# Altium schematic symbol library FPGA_Xilinx_Virtex5.SchLib: 41 symbols (part 12 of 17) (continued)
## XC5VLX330-FF1760 (continued)
part L pins: AU10 VCCO_30, AV1 IO_L0P_30, AV7 VCCO_30, AW1 IO_L0N_30, AW2 IO_L1P_30, AW3 IO_L3N_30, AW5 IO_L5N_30, AW6 IO_L9N_CC_30, AW7 IO_L9P_CC_30, AW8 IO_L11N_CC_30, AW10 IO_L13N_30, AW11 IO_L16P_30, AW12 IO_L16N_30, AY2 IO_L1N_30, AY3 IO_L3P_30, AY4 IO_L6P_30, AY5 IO_L5P_30, AY7 IO_L11P_CC_30, AY8 IO_L15P_30, AY9 IO_L15N_30, AY10 IO_L13P_30, AY12 IO_L19N_30, AY13 IO_L19P_30, BA1 IO_L2P_30, BA2 IO_L2N_30, BA4 IO_L6N_30, BA5 IO_L7P_30, BA6 IO_L10N_CC_30, BA7 IO_L8N_CC_30, BA8 VCCO_30, BA9 IO_L12N_VRP_30, BA10 IO_L14N_VREF_30, BA11 IO_L18N_30, BA12 IO_L17P_30, BB2 IO_L4P_30, BB3 IO_L4N_VREF_30, BB4 IO_L7N_30, BB6 IO_L10P_CC_30, BB7 IO_L8P_CC_30, BB8 IO_L12P_VRN_30, BB9 IO_L14P_30, BB11 IO_L18P_30, BB12 IO_L17N_30, D15 IO_L0N_31, D16 IO_L2P_31, D17 IO_L2N_31, D18 IO_L6P_31, D20 IO_L9N_CC_31, D21 IO_L9P_CC_31, D22 IO_L8P_CC_31, D23 IO_L8N_CC_31, D25 IO_L12P_VRN_31, D26 IO_L12N_VRP_31, D27 IO_L17P_31, D28 IO_L17N_31, D29 VCCO_31, D30 IO_L19P_31, E14 IO_L0P_31, E15 IO_L1P_31, E17 IO_L4N_VREF_31, E18 IO_L6N_31, E19 IO_L7P_31, E20 IO_L5P_31, E22 IO_L10N_CC_31, E23 IO_L11P_CC_31, E24 IO_L13P_31, E25 IO_L13N_31, E27 IO_L14N_VREF_31, E28 IO_L16N_31, E29 IO_L16P_31, E30 IO_L19N_31, F14 IO_L1N_31, F15 IO_L3N_31, F16 IO_L3P_31, F17 IO_L4P_31, F19 IO_L7N_31, F20 IO_L5N_31, F21 IO_L10P_CC_31, F24 IO_L11N_CC_31, F25 IO_L15N_31, F26 IO_L15P_31, F27 IO_L14P_31, F29 IO_L18N_31, F30 IO_L18P_31, G30 VCCO_31, H27 VCCO_31
part M pins: A14 IO_L16P_32, A15 IO_L16N_32, A16 IO_L14P_32, A17 IO_L14N_VREF_32, A19 IO_L12P_VRN_32, A20 IO_L10P_CC_32, A21 IO_L11P_CC_32, A22 IO_L11N_CC_32, A24 IO_L6N_32, A25 IO_L4N_VREF_32, A26 IO_L1N_32, A27 IO_L3N_32, A29 IO_L0P_32, AU14 IO_L18P_33, AU16 IO_L14N_VREF_33, AU17 IO_L14P_33, AU18 IO_L12P_VRN_33, AU19 IO_L12N_VRP_33, AU22 IO_L9N_CC_33, AU23 IO_L9P_CC_33, AU24 IO_L3N_33, AU26 IO_L1N_33, AU27 IO_L4N_VREF_33, AU28 IO_L4P_33, AU30 VCCO_33, AV13 IO_L16P_33, AV14 IO_L18N_33, AV15 IO_L19N_33, AV16 IO_L17N_33, AV18 IO_L15N_33, AV19 IO_L13N_33, AV20 IO_L10N_CC_33, AV21 IO_L10P_CC_33, AV23 IO_L7N_33, AV24 IO_L7P_33, AV25 IO_L3P_33, AV26 IO_L1P_33, AV28 IO_L6N_33, AV29 IO_L0P_33, AV30 IO_L2P_33, AW13 IO_L16N_33, AW15 IO_L19P_33, AW16 IO_L17P_33, AW17 IO_L15P_33, AW18 IO_L13P_33, AW20 IO_L11N_CC_33, AW21 IO_L11P_CC_33, AW22 IO_L5N_33, AW23 IO_L5P_33, AW25 IO_L8N_CC_33, AW26 IO_L8P_CC_33, AW27 IO_L6P_33, AW28 IO_L0N_33, AW30 IO_L2N_33, AY31 VCCO_33, B13 IO_L19P_32, B14 IO_L19N_32, B15 VCCO_32, B16 IO_L17P_32, B17 IO_L15P_32, B18 IO_L15N_32, B19 IO_L12N_VRP_32, B21 IO_L10N_CC_32, B22 IO_L8N_CC_32, B23 IO_L6P_32, B24 IO_L4P_32, B26 IO_L7N_32, B27 IO_L1P_32, B28 IO_L3P_32, B29 IO_L0N_32, BA28 VCCO_33, C12 VCCO_32, C14 IO_L18P_32, C15 IO_L18N_32, C16 IO_L17N_32, C18 IO_L13P_32, C19 IO_L13N_32, C20 IO_L9N_CC_32, C21 IO_L9P_CC_32, C23 IO_L8P_CC_32, C24 IO_L5P_32, C25 IO_L5N_32, C26 IO_L7P_32, C28 IO_L2N_32, C29 IO_L2P_32, F13 VCCO_32
part N pins: AK17 IO_L1N_GC_D12_4, AK27 IO_L0N_GC_D14_4, AK28 IO_L0P_GC_D15_4, AL16 IO_L1P_GC_D13_4, AL27 IO_L8P_CC_GC_4, AM13 IO_L5P_GC_4, AM14 IO_L5N_GC_4, AM16 IO_L3N_GC_D8_4, AM27 IO_L8N_CC_GC_4, AM28 IO_L6P_GC_4, AM29 IO_L2P_GC_D11_4, AN13 IO_L9N_CC_GC_4, AN14 IO_L7N_GC_VRP_4, AN15 IO_L7P_GC_VRN_4, AN16 IO_L3P_GC_D9_4, AN28 IO_L6N_GC_4, AN29 IO_L4N_GC_VREF_4, AN30 IO_L2N_GC_D10_4, AP13 IO_L9P_CC_GC_4, AP30 IO_L4P_GC_4, AT13 VCCO_34, AV17 VCCO_4, AW14 VCCO_34, AY11 VCCO_34, AY14 IO_L1P_34, AY15 IO_L1N_34, AY17 IO_L7P_34, AY18 IO_L7N_34, AY19 IO_L6P_34, AY20 IO_L10N_CC_34, AY22 IO_L11P_CC_34, AY23 IO_L11N_CC_34, AY24 IO_L12N_VRP_34, AY25 IO_L12P_VRN_34, AY27 IO_L17P_34, AY28 IO_L17N_34, AY29 IO_L19N_34, BA14 IO_L0N_34, BA15 IO_L3P_34, BA16 IO_L2N_34, BA17 IO_L5N_34, BA18 VCCO_4, BA19 IO_L6N_34, BA20 IO_L10P_CC_34, BA21 IO_L8P_CC_34, BA22 IO_L8N_CC_34, BA24 IO_L13N_34, BA25 IO_L15N_34, BA26 IO_L14N_VREF_34, BA27 IO_L16P_34, BA29 IO_L19P_34, BB13 IO_L0P_34, BB14 IO_L3N_34, BB16 IO_L2P_34, BB17 IO_L5P_34, BB18 IO_L4P_34, BB19 IO_L4N_VREF_34, BB21 IO_L9P_CC_34, BB22 IO_L9N_CC_34, BB23 IO_L13P_34, BB24 IO_L15P_34, BB26 IO_L14P_34, BB27 IO_L16N_34, BB28 IO_L18N_34, BB29 IO_L18P_34
part O pins: AJ18 IO_L16N_6, AJ25 IO_L17P_6, AK18 IO_L1P_6, AK19 IO_L16P_6, AK24 IO_L17N_6, AK25 IO_L19N_6, AL17 IO_L1N_6, AL19 IO_L18P_6, AL24 IO_L19P_6, AL25 IO_L15P_6, AL26 IO_L0P_6, AM17 IO_L3N_6, AM18 IO_L3P_6, AM19 IO_L18N_6, AM24 IO_L15N_6, AM26 IO_L0N_6, AN18 IO_L5P_6, AN19 IO_L7P_6, AN25 IO_L4N_VREF_6, AN26 IO_L4P_6, AP15 IO_L9N_CC_6, AP16 IO_L12P_VRN_6, AP17 IO_L5N_6, AP18 IO_L7N_6, AP26 IO_L6P_6, AP27 IO_L2N_6, AP28 IO_L2P_6, AR13 IO_L10P_CC_6, AR14 IO_L10N_CC_6, AR15 IO_L9P_CC_6, AR17 IO_L12N_VRP_6, AR27 IO_L6N_6, AR28 IO_L8P_CC_6, AR29 IO_L8N_CC_6, AR30 IO_L11N_CC_6, AT14 IO_L14P_6, AT15 IO_L14N_VREF_6, AT23 VCCO_6, AT29 IO_L13N_6, AT30 IO_L11P_CC_6, AU29 IO_L13P_6, AW24 VCCO_6, AY21 VCCO_6, B25 VCCO_5, C22 VCCO_5, F23 VCCO_5, G14 IO_L1P_5, G16 IO_L3N_5, G27 IO_L15P_5, G28 IO_L17P_5, G29 IO_L17N_5, H14 IO_L1N_5, H15 IO_L7P_5, H16 IO_L3P_5, H28 IO_L15N_5, H29 IO_L19P_5, H30 IO_L19N_5, J15 IO_L7N_5, J16 IO_L5N_5, J17 IO_L5P_5, J26 IO_L11P_CC_5, J27 IO_L11N_CC_5, J28 IO_L13P_5, K17 IO_L12P_VRN_5, K18 IO_L12N_VRP_5, K19 IO_L9P_CC_5, K24 IO_L4N_VREF_5, K25 IO_L4P_5, K27 IO_L13N_5, L17 IO_L14N_VREF_5, L19 IO_L9N_CC_5, L24 IO_L2N_5, L25 IO_L2P_5, L26 IO_L6N_5, M17 IO_L14P_5, M18 IO_L10P_CC_5, M19 IO_L10N_CC_5, M24 IO_L0P_5, M26 IO_L6P_5, N18 IO_L16P_5, N19 IO_L16N_5, N24 IO_L0N_5, N25 IO_L8N_CC_5, P18 IO_L18N_5, P25 IO_L8P_CC_5, R18 IO_L18P_5
part P pins: AJ20 IO_L1N_8, AJ21 IO_L1P_8, AJ22 IO_L0N_8, AJ23 IO_L0P_8, AK20 IO_L3P_8, AK22 IO_L2N_8, AK23 IO_L2P_8, AL20 IO_L3N_8, AL21 IO_L5N_8, AL22 IO_L17P_8, AM21 IO_L5P_8, AM22 IO_L17N_8, AM23 IO_L15P_8, AN20 IO_L7N_8, AN21 IO_L9P_CC_8, AN23 IO_L15N_8, AN24 IO_L13N_8, AP19 VCCO_8, AP20 IO_L7P_8, AP21 IO_L9N_CC_8, AP22 IO_L19N_8, AP23 IO_L13P_8, AP25 IO_L4P_8, AR16 VCCO_8, AR18 IO_L10P_CC_8, AR19 IO_L10N_CC_8, AR20 IO_L14P_8, AR22 IO_L19P_8, AR23 IO_L11P_CC_8, AR24 IO_L11N_CC_8, AR25 IO_L4N_VREF_8, AT16 IO_L12P_VRN_8, AT17 IO_L12N_VRP_8, AT19 IO_L14N_VREF_8, AT20 IO_L16P_8, AT21 IO_L16N_8, AT22 IO_L18N_8, AT24 IO_L8N_CC_8, AT25 IO_L8P_CC_8, AT26 IO_L6N_8, AT27 IO_L6P_8, AU20 VCCO_8, AU21 IO_L18P_8, D19 VCCO_7, F22 IO_L11N_CC_7, G17 IO_L12P_VRN_7, G18 IO_L12N_VRP_7, G19 IO_L10N_CC_7, G20 VCCO_7, G21 IO_L9P_CC_7, G22 IO_L11P_CC_7, G23 IO_L13N_7, G24 IO_L15N_7, G26 IO_L19P_7, H17 VCCO_7, H18 IO_L14N_VREF_7, H19 IO_L10P_CC_7, H20 IO_L9N_CC_7, H21 IO_L7N_7, H23 IO_L13P_7, H24 IO_L15P_7, H25 IO_L17P_7, H26 IO_L19N_7, J18 IO_L14P_7, J20 IO_L16N_7, J21 IO_L7P_7, J22 IO_L8P_CC_7, J23 IO_L8N_CC_7, J25 IO_L17N_7, K20 IO_L16P_7, K22 IO_L6P_7, K23 IO_L6N_7, L20 IO_L18P_7, L21 IO_L18N_7, L22 IO_L4P_7, M21 IO_L5N_7, M22 IO_L4N_VREF_7, M23 IO_L0P_7, N20 IO_L1N_7, N21 IO_L3N_7, N22 IO_L5P_7, N23 IO_L0N_7, P20 IO_L1P_7, P21 IO_L3P_7, P22 IO_L2N_7, P23 IO_L2P_7
part Q pins: AA21 VREFN_0, AA22 VP_0, AB21 VN_0, AB22 VREFP_0, AC21 DXN_0, AC22 DXP_0, AE30 TCK_0, AF14 TMS_0, AF15 CCLK_0, AF30 M1_0, AG14 TDI_0, AG29 M0_0, AG30 VCCO_0, AH14 TDO_0, AH15 D_OUT_BUSY_0, AH28 M2_0, AL28 VCCO_0, R14 D_IN_0, R30 RDWR_B_0, T14 HSWAPEN_0, T15 DONE_0, T29 PROGRAM_B_0, T30 CS_B_0, U14 INIT_B_0
part R pins: A3 GND, A8 GND, A13 GND, A18 GND, A23 GND, A28 GND, A33 GND, A38 GND, AA12 VCCAUX, AA14 VCCINT, AA16 VCCINT, AA18 VCCINT, AA20 VCCINT, AA24 VCCINT, AA26 VCCINT, AA28 VCCINT, AA30 VCCAUX, AB13 VCCINT, AB15 VCCINT, AB17 VCCINT, AB19 VCCINT, AB23 VCCINT, AB25 VCCINT, AB27 VCCINT, AB29 VCCAUX, AB31 VCCAUX, AC12 VCCAUX, AC14 VCCINT, AC16 VCCINT, AC18 VCCINT, AC20 VCCINT, AC24 VCCINT, AC26 VCCINT, AC28 VCCINT, AC30 VCCAUX, AD13 VCCAUX, AD15 VCCINT, AD17 VCCINT, AD19 VCCINT, AD21 VCCINT, AD23 VCCINT, AD25 VCCINT, AD27 VCCINT, AD29 VCCAUX, AE12 VCCAUX, AE14 VCCINT, AE16 VCCINT, AE18 VCCINT, AE20 VCCINT, AE22 VCCINT, AE24 VCCINT, AE26 VCCINT, AE28 VCCINT, AF13 VCCAUX, AF17 VCCINT, AF19 VCCINT, AF21 VCCINT, AF23 VCCINT, AF25 VCCINT, AF27 VCCINT, AF29 VCCAUX, AG16 VCCINT, AG18 VCCINT, AG20 VCCINT, AG22 VCCINT, AG24 VCCINT, AG26 VCCINT, AG28 VCCINT, AH13 VCCAUX, AH17 VCCINT, AH19 VCCINT, AH21 VCCINT, AH23 VCCINT, AH25 VCCINT, AH27 VCCINT, AJ24 VCCINT, B5 GND, B10 GND, B20 GND, B30 GND, B40 GND, C2 GND, C7 GND, C17 GND, C27 GND, C37 GND, C42 GND, D4 GND, D14 GND, D24 GND, D34 GND, E1 GND, E11 GND, E21 GND, E31 GND, E41 GND, F8 GND, F18 GND, F28 GND, F38 GND, G5 GND, G15 GND, G25 GND, G35 GND, H2 GND, H12 GND, H22 GND, H32 GND, H42 GND, J9 GND, J19 GND, J29 GND, J34 GND, J39 GND, K1 GND, K6 GND, K11 GND, K16 GND, K21 GND, K26 GND, K31 GND, K36 GND, L3 GND, L13 GND, L18 GND, L23 GND, L28 GND, L33 GND, M10 GND, M15 GND, M20 GND, M25 GND, M30 GND, M40 GND, N2 GND, N7 GND, N12 GND, N17 GND, N27 GND, N32 GND, N37 GND, N42 GND, P4 GND, P14 GND, P19 GND, P24 GND, P29 GND, P34 GND, R1 GND, R11 GND, R12 VCCAUX, R13 GND, R16 GND, R19 GND, R20 VCCINT, R21 GND, R22 VCCINT, R23 GND, R24 VCCINT, R25 GND, R26 VCCINT, R29 VBATT_0, R31 GND, R41 GND, T8 GND, T12 GND, T13 VCCAUX, T16 GND, T17 VCCINT, T18 GND, T19 VCCINT, T20 GND, T21 VCCINT, T22 GND, T23 VCCINT, T24 GND, T25 VCCINT, T26 GND, T27 VCCINT, T28 GND, T33 GND, U12 VCCAUX, U16 VCCINT, U18 VCCINT, U20 VCCINT, U22 VCCINT, U24 VCCINT, U26 VCCINT, U28 VCCINT, U30 VCCAUX, V13 VCCINT, V15 VCCINT, V17 VCCINT, V19 VCCINT, V21 VCCINT, V23 VCCINT, V25 VCCINT, V27 VCCINT, V29 VCCAUX, W12 VCCAUX, W14 VCCINT, W16 VCCINT, W18 VCCINT, W20 VCCINT, W22 VCCINT, W24 VCCINT, W26 VCCINT, W28 VCCINT, W30 VCCAUX, Y13 VCCINT, Y15 VCCINT, Y17 VCCINT, Y19 VCCINT, Y21 AVSS_0, Y22 AVDD_0, Y23 VCCINT, Y25 VCCINT, Y27 VCCINT, Y29 VCCINT, Y31 VCCAUX
part S pins: AA3 GND, AA13 GND, AA15 GND, AA17 GND, AA19 GND, AA23 GND, AA25 GND, AA27 GND, AA29 GND, AA31 GND, AA33 GND, AB10 GND, AB12 GND, AB14 GND, AB16 GND, AB18 GND, AB20 GND, AB24 GND, AB26 GND, AB28 GND, AB30 GND, AB40 GND, AC2 GND, AC7 GND, AC13 GND, AC15 GND, AC17 GND, AC19 GND, AC23 GND, AC25 GND, AC27 GND, AC29 GND, AC31 GND, AC32 GND, AC37 GND, AC42 GND, AD4 GND, AD12 GND, AD14 GND, AD16 GND, AD18 GND, AD20 GND, AD22 GND, AD24 GND, AD26 GND, AD28 GND, AD30 GND, AD34 GND, AE1 GND, AE11 GND, AE13 GND, AE15 GND, AE17 GND, AE19 GND, AE21 GND, AE23 GND, AE25 GND, AE27 GND, AE29 GND, AE31 GND, AE41 GND, AF8 GND, AF16 GND, AF18 GND, AF20 GND, AF22 GND, AF24 GND, AF26 GND, AF28 GND, AF33 GND, AF38 GND, AG5 GND, AG13 GND, AG15 GND, AG17 GND, AG19 GND, AG21 GND, AG23 GND, AG25 GND, AG27 GND, AG35 GND, AH2 GND, AH12 GND, AH18 GND, AH20 GND, AH22 GND, AH24 GND, AH26 GND, AH32 GND, AH42 GND, AJ9 GND, AJ14 GND, AJ19 GND, AJ29 GND, AJ39 GND, AK1 GND, AK6 GND, AK11 GND, AK16 GND, AK21 GND, AK26 GND, AK31 GND, AK36 GND, AK41 GND, AL3 GND, AL13 GND, AL18 GND, AL23 GND, AL33 GND, AM10 GND, AM15 GND, AM20 GND, AM25 GND, AM30 GND, AM40 GND, AN2 GND, AN7 GND, AN12 GND, AN17 GND, AN22 GND, AN27 GND, AN32 GND, AN37 GND, AN42 GND, AP4 GND, AP14 GND, AP24 GND, AP29 GND, AP34 GND, AR1 GND, AR11 GND, AR21 GND, AR31 GND, AR41 GND, AT8 GND, AT18 GND, AT28 GND, AT38 GND, AU5 GND, AU15 GND, AU25 GND, AU35 GND, AV2 GND, AV12 GND, AV22 GND, AV32 GND, AV42 GND, AW9 GND, AW19 GND, AW29 GND, AW39 GND, AY1 GND, AY6 GND, AY16 GND, AY26 GND, AY36 GND, AY41 GND, BA3 GND, BA13 GND, BA23 GND, BA33 GND, BA38 GND, BB5 GND, BB10 GND, BB15 GND, BB20 GND, BB25 GND, BB30 GND, BB35 GND, BB40 GND, T38 GND, U5 GND, U10 GND, U13 GND, U15 GND, U17 GND, U19 GND, U21 GND, U23 GND, U25 GND, U27 GND, U29 GND, U35 GND, V2 GND, V12 GND, V14 GND, V16 GND, V18 GND, V20 GND, V22 GND, V24 GND, V26 GND, V28 GND, V30 GND, V32 GND, V42 GND, W9 GND, W13 GND, W15 GND, W17 GND, W19 GND, W21 GND, W23 GND, W25 GND, W27 GND, W29 GND, W31 GND, W34 GND, W39 GND, Y1 GND, Y6 GND, Y11 GND, Y12 GND, Y14 GND, Y16 GND, Y18 GND, Y20 GND, Y24 GND, Y26 GND, Y28 GND, Y30 GND, Y36 GND

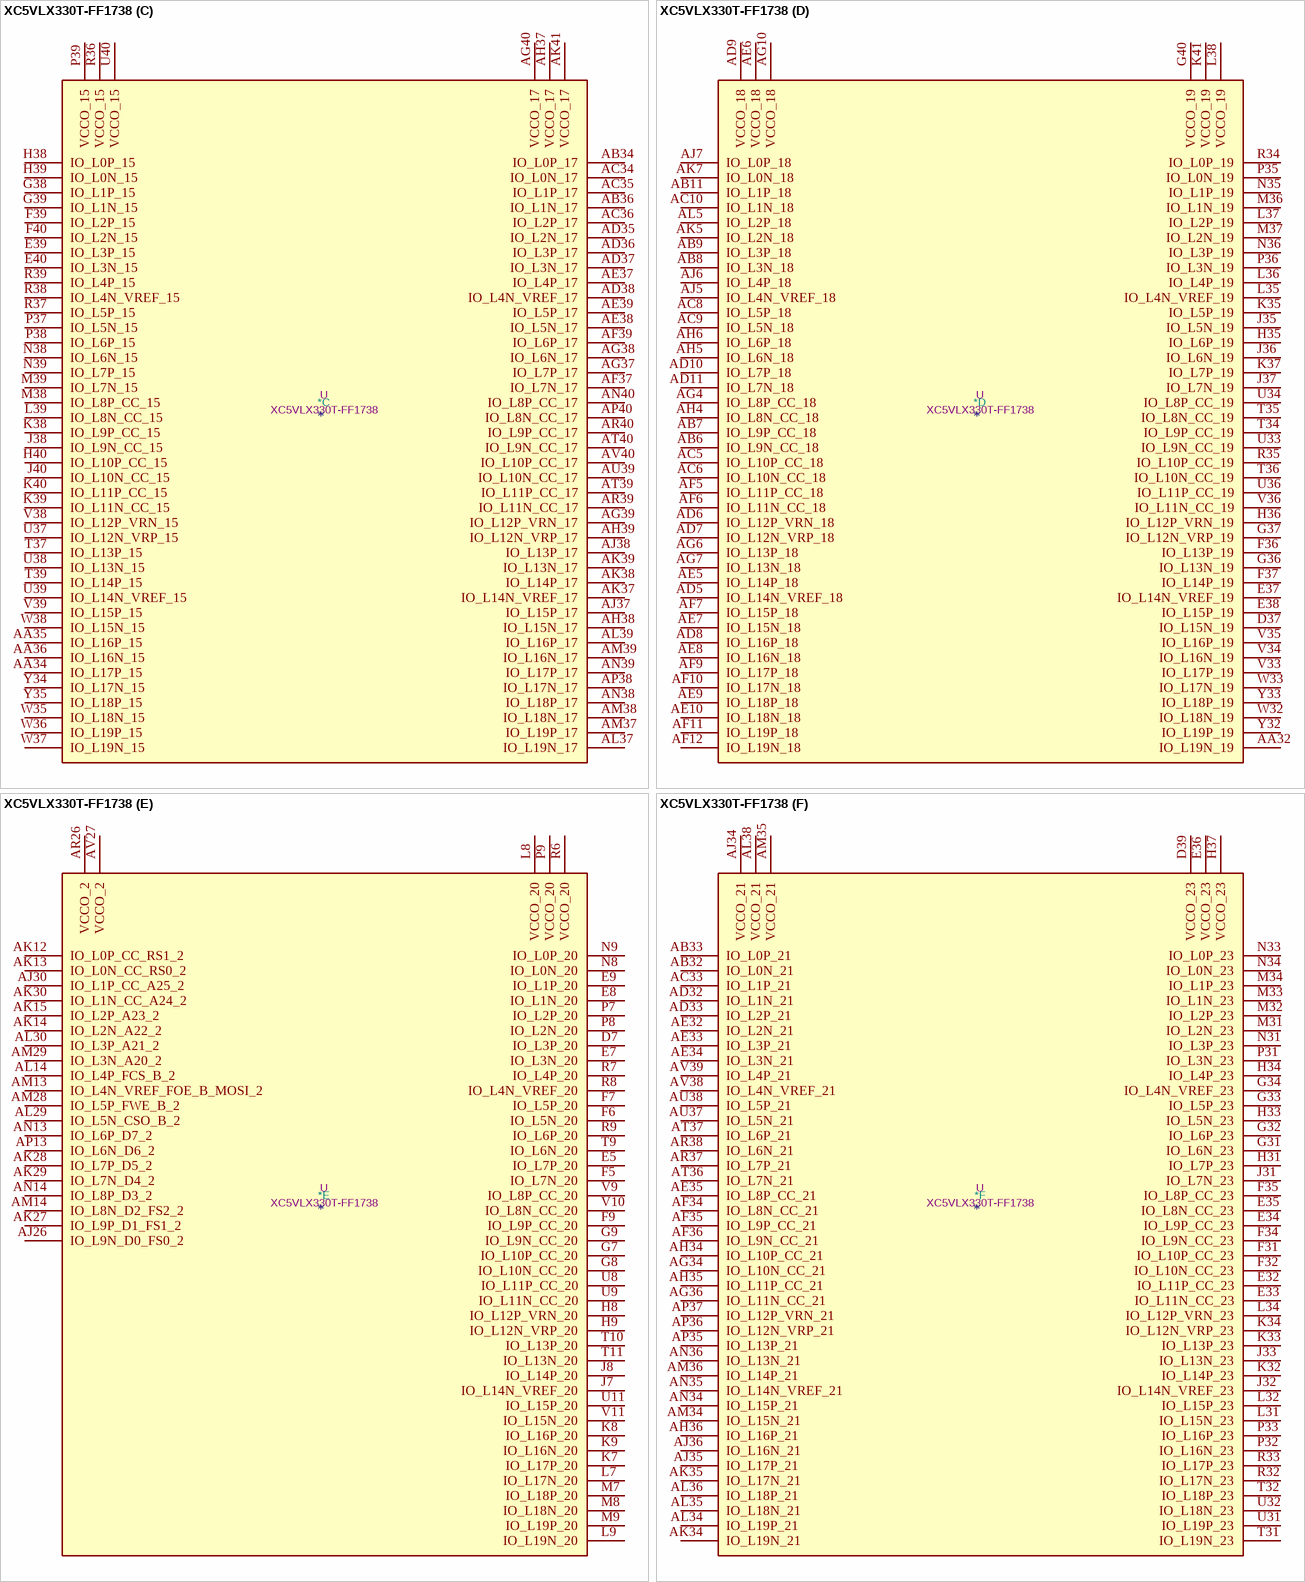
[diagram p104: symbol XC5VLX330T-FF1738]

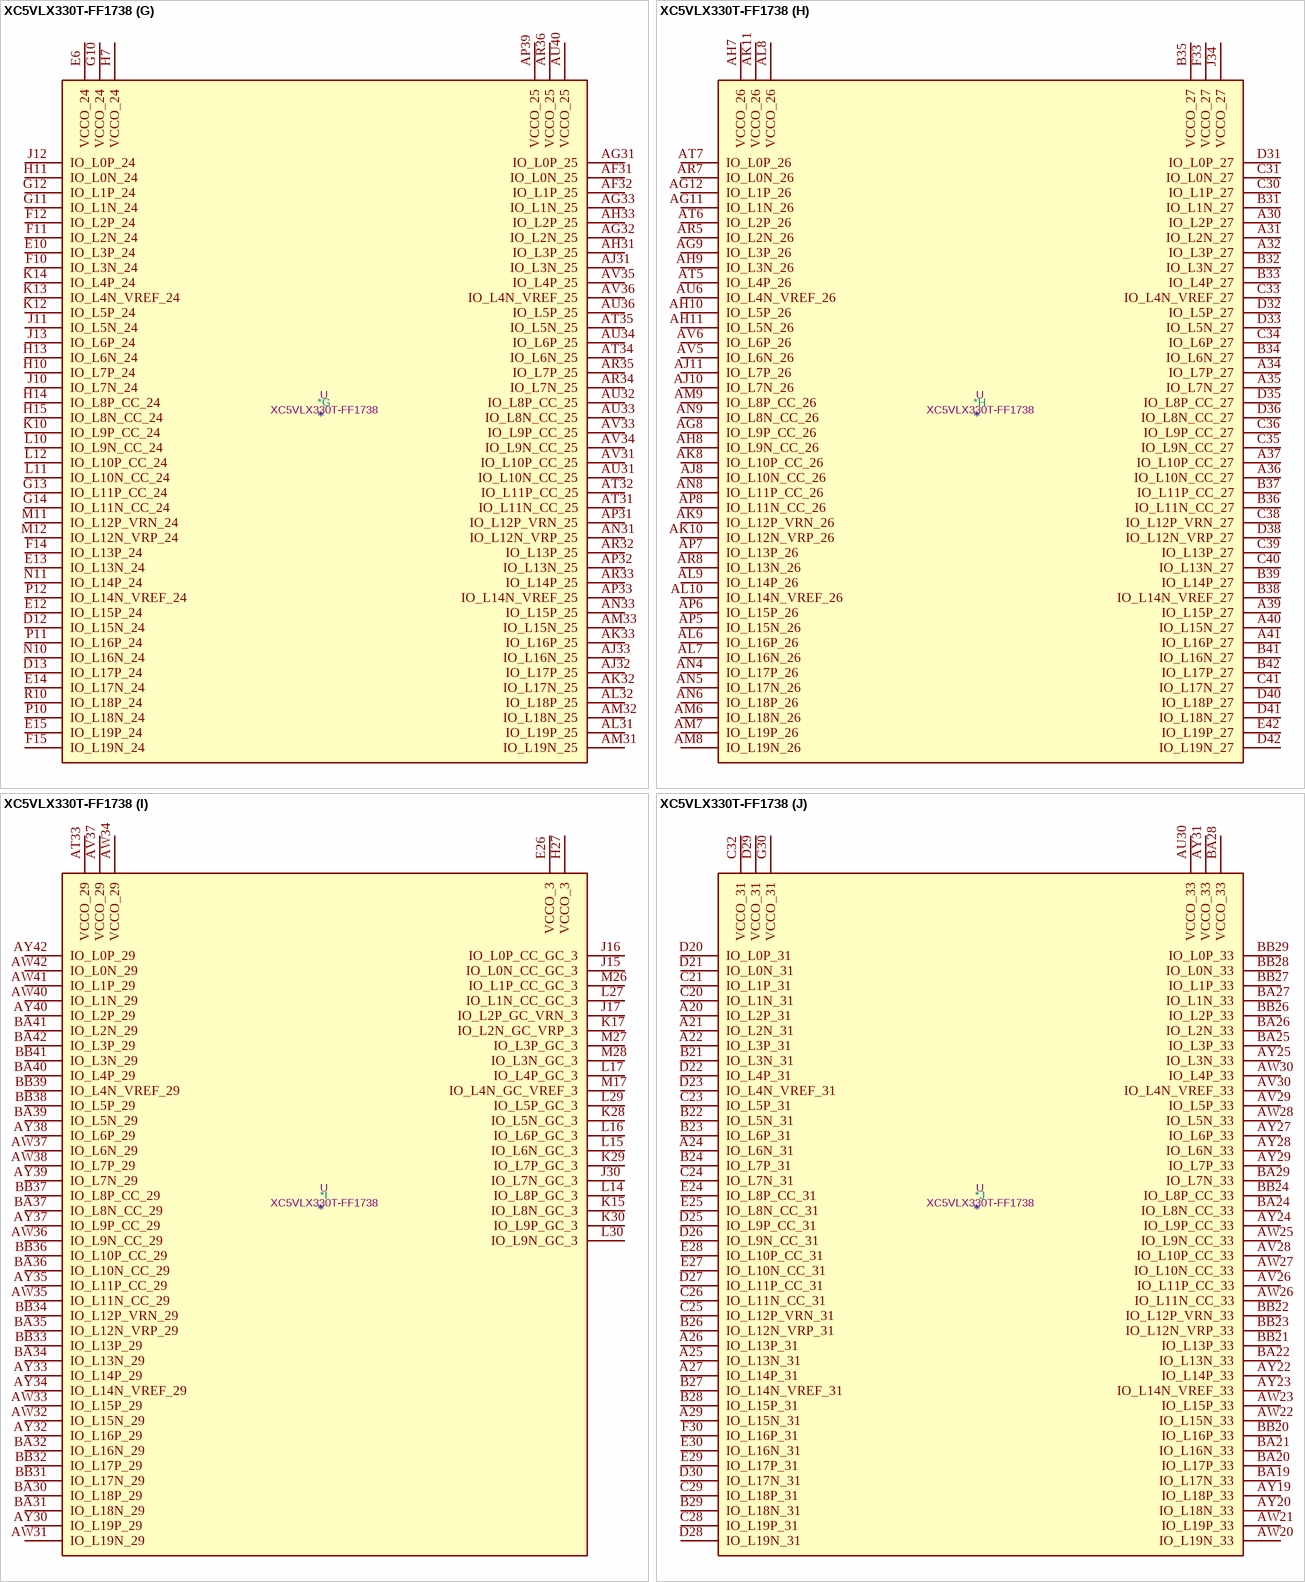
[diagram p105: symbol XC5VLX330T-FF1738]

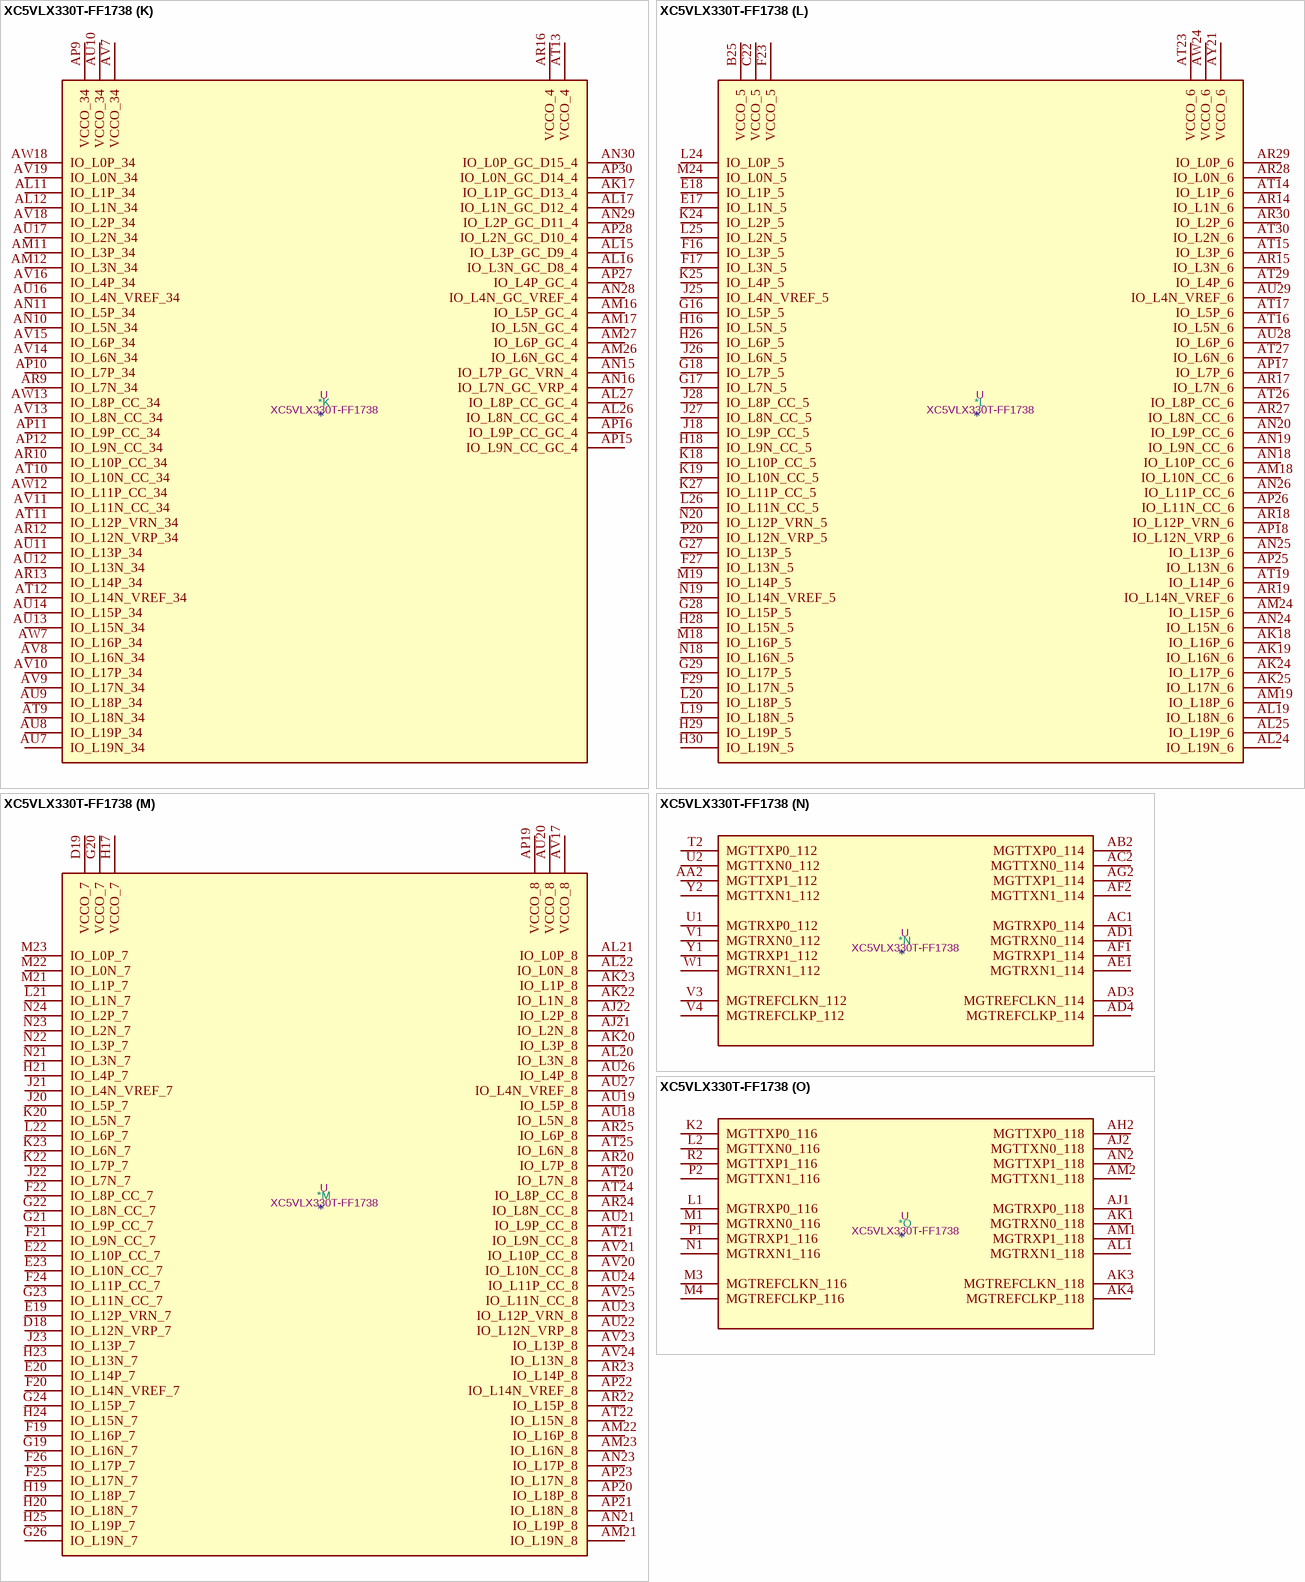
[diagram p106: symbol XC5VLX330T-FF1738]

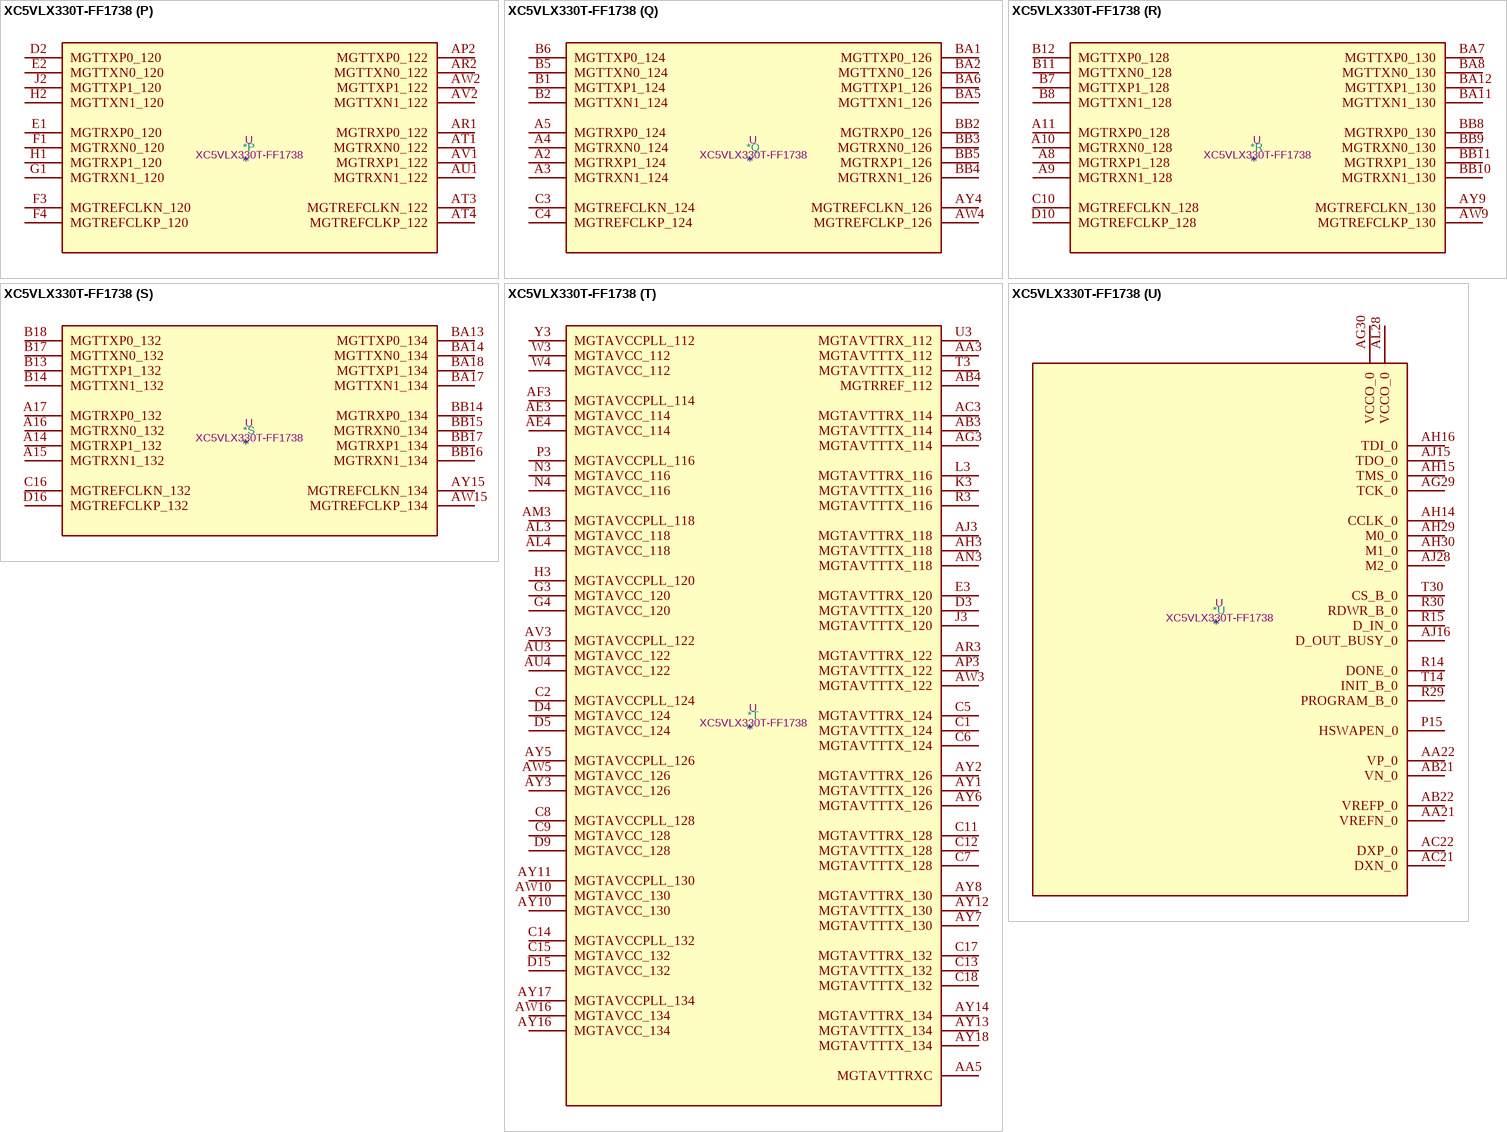
[diagram p107: symbol XC5VLX330T-FF1738]

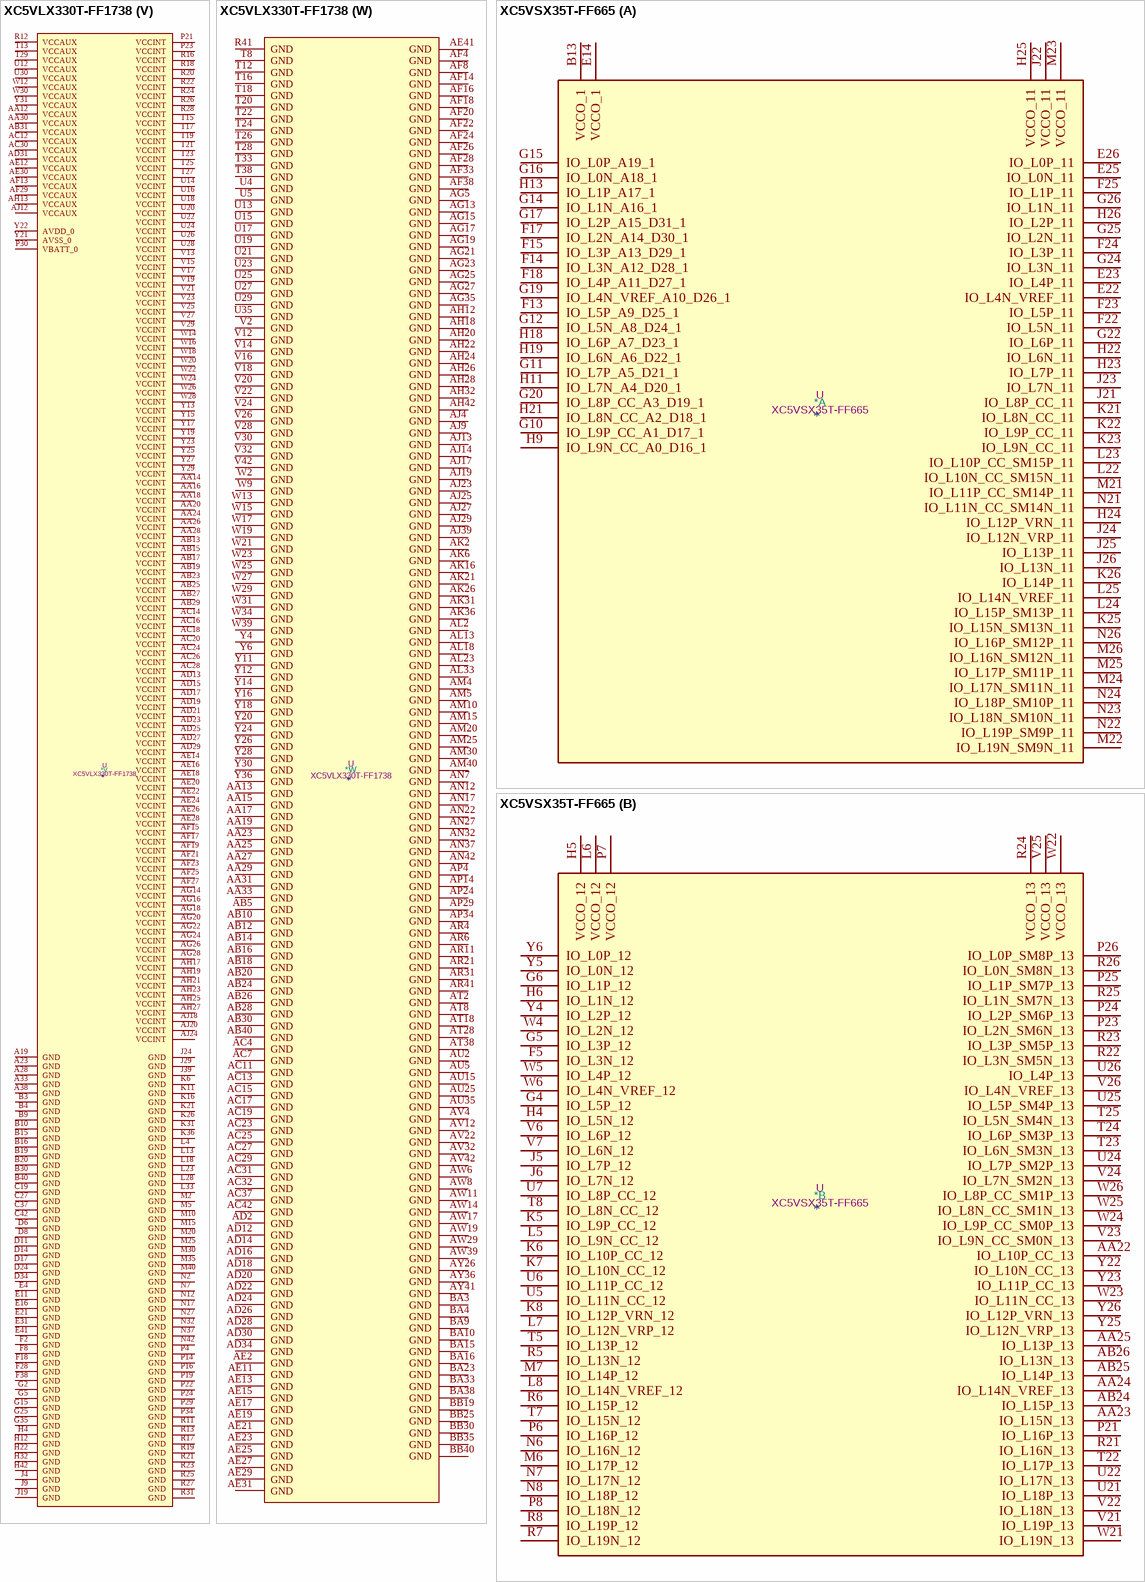
[diagram p108: symbols XC5VLX330T-FF1738 to XC5VSX35T-FF665]